# Altium integrated library wifi-plug.IntLib: 20 symbols
Pins are listed as number, name and electrical type; pins without a type are passive.

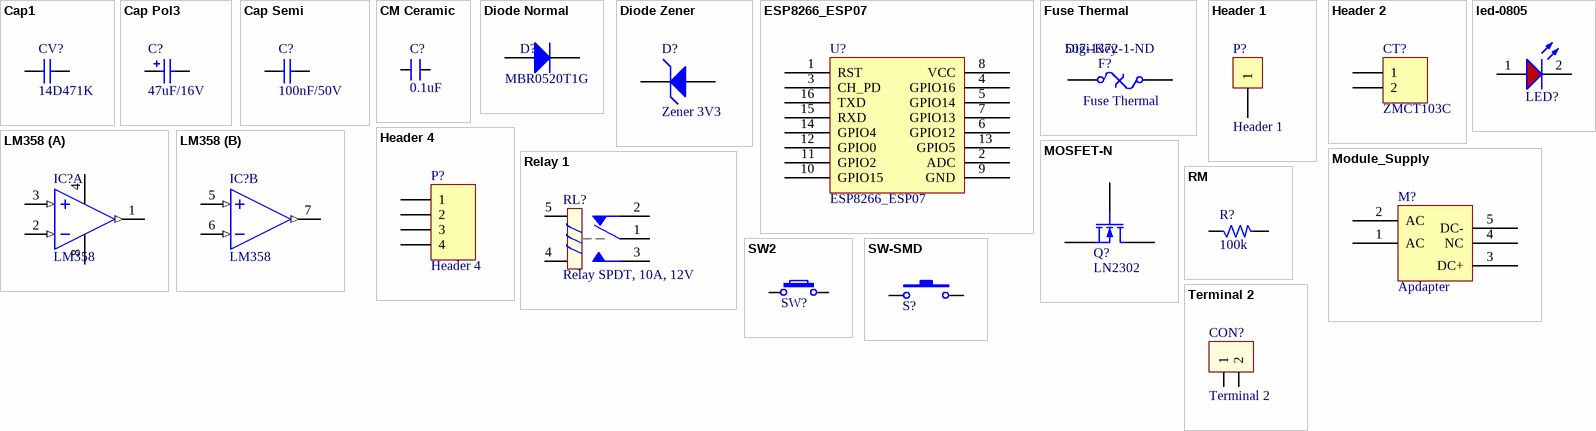
[diagram p0: symbols Cap1 to Terminal 2]

## Cap1
designator CV?  value 14D471K  (hidden comment: Cap1)
Polar Capacitor; Published: 8-Jun-2000; LatestRevisionDate: 17-Jul-2002; LatestRevisionNote: Re-released for DXP Platform.; PackageReference: RAD-0.3; Publisher: Altium Limited; PackageDescription: Radial Cap, Thru-Hole; 2 Leads; 0.3 in Pin Spacing
footprint C104/270V (Tu loc 220)
footprint C104/400V (Capacitor Polyester)
footprint C105/400V (Capacitor Polyester)
footprint C224/400V (Capacitor Polyester)
footprint C_Ceramic (Ceramic Capacitor)
footprint C_Ceramic_KV (Ceramic capacitors)
footprint C_Tantalum (Tantalum_Capacitor)
footprint C_Tantalum2 (Tantalum Capacitor)
pins: 1, 2

## Cap Pol3
designator C?, comment 47uF/16V
Polarized Capacitor (Surface Mount); Published: 8-Jun-2000; LatestRevisionDate: 29-May-2009; LatestRevisionNote: IPC-7351 Footprint Added.; PackageReference: C0805; Publisher: Altium Limited; PackageDescription: Chip Capacitor; Supplier 1: Newark; Supplier Part Number 1: 31T8184
footprint CAPC2012L (Chip Capacitor, Body 2.0x1.3mm, IPC High Density)
footprint CAPC4532L (Chip Capacitor, Body 4.5x3.2mm, IPC High Density)
footprint CAPC4564L (Chip Capacitor, Body 4.5x6.4mm, IPC High Density)
footprint CAPC5764L (Chip Capacitor, Body 5.7x6.4mm, IPC High Density)
footprint CAPC5750L (Chip Capacitor, Body 5.7x5.0mm, IPC High Density)
simulation model CAP (Capacitor)
signal-integrity model Cap Pol
footprint CAPC3216L
footprint C2312 (Chip Capacitor, 2-Leads, Body 7.30x4.30mm, IPC Medium Density)
pins: 1, 2
1 alternate drawing of the same symbol

## Cap Semi
designator C?, comment 100nF/50V
Capacitor 100n 16V 0603; Published: 8-Jun-2000; LatestRevisionDate: 29-May-2009; LatestRevisionNote: IPC-7351 Footprint Added.; PackageReference: C1206; Publisher: Altium Limited; PackageDescription: Chip Capacitor
footprint CAPC3216L (Chip Capacitor, Body 3.2x1.6mm, IPC High Density)
footprint CAPC1005L (Chip Capacitor, Body 1.0x0.5mm, IPC High Density)
footprint CAPC2512L (Chip Capacitor, Body 2.54x1.27mm, IPC High Density)
footprint CAPC1608L (Chip Capacitor, Body 1.6x0.8mm, IPC High Density)
footprint CAPC3225L (Chip Capacitor, Body 3.2x2.5mm, IPC High Density)
simulation model CAP (Semiconductor Capacitor)
signal-integrity model Cap Semi
footprint CAPC2012L
footprint C0805 (Chip Capacitor; Body 2.0 x 1.2 mm (LxW typ))
footprint C0603
footprint C1608L
footprint C2012L
pins: 1, 2

## CM Ceramic
designator C?, comment 0.1uF
SMD Ceramic  Capacitor; Manufacturer No: C0805KRX7R9BB104; Manufacturer: Yageo; Voltage: 50V; Tolerance: 10%; Capacitance: 0.1uF; Specification: ="Capacitance"+" "+"Voltage"+" " +"Tolerance"
footprint C0805 (Chip Capacitor; Body 2.0 x 1.2 mm (LxW typ))
footprint CM 0603
footprint CM 104
pins: 1, 2

## Diode Normal
designator D?, comment MBR0520T1G
Diode Normal; Published: 8-Jun-2000; LatestRevisionDate: 17-Jul-2002; LatestRevisionNote: Re-released for DXP Platform.; DatasheetDocument: 1997; PackageReference: DO-35; Publisher: Altium Limited; Code_JEDEC: DO-204-AH; ComponentLink1Description: Manufacturer Link; ComponentLink1URL: http://www.fairchildsemi.com/; ComponentLink2Description: Datasheet; ComponentLink2URL: http://www.fairchildsemi.com/ds/1N%2F1N4448.pdf
footprint SOD-123 W (SOD-123; 2 Leads; Body 2.7 x 1.6 mm, (LxW))
pins: 1 A, 2 K

## Diode Zener
designator D?, comment Zener 3V3
Zener Voltage Regulators; Manufacturer No: MMSZ5222BT1G; Manufacturer: ON Semiconductor; Specification: 500 mW SOD−123 Surface Mount
footprint SOD-123
pins: 1 K, 2 A

## ESP8266_ESP07
designator U?
footprint ESP_12 (ESP-12 Wi-Fi Module by AI-Thinker)
pins: 1 RST, 2 ADC, 3 CH_PD, 4 GPIO16, 5 GPIO14, 6 GPIO12, 7 GPIO13, 8 VCC, 9 GND, 10 GPIO15, 11 GPIO2, 12 GPIO0, 13 GPIO5, 14 GPIO4, 15 RXD, 16 TXD

## Fuse Thermal
designator F?  Supplier 1: Digi-Key  Supplier Part Number 1: 507-1372-1-ND
Thermal Fuse; Published: 24-Mar-1999; LatestRevisionDate: 17-Jul-2002; LatestRevisionNote: Re-released for DXP Platform.; PackageReference: PIN-W2/E2.8; Publisher: Altium Limited
footprint PTC1812
pins: 1, 2

## Header 1
designator P?
Header, 1-Pin; LatestRevisionDate: 17-Jul-2002; LatestRevisionNote: Re-released for DXP Platform.; Publisher: Altium Limited
footprint PAD 1
footprint HDR1X2 - female (Connector; Header; 2 Position)
pins: 1

## Header 2
designator CT?, comment ZMCT103C
Header, 2-Pin; LatestRevisionDate: 17-Jul-2002; LatestRevisionNote: Re-released for DXP Platform.; Publisher: Altium Limited
footprint ZMCT103C (Connector; Header; 2 Position)
footprint HDR1X2 - female (Connector; Header; 2 Position)
pins: 1, 2

## Header 4
designator P?
Header, 4-Pin; LatestRevisionDate: 17-Jul-2002; LatestRevisionNote: Re-released for DXP Platform.; Publisher: Altium Limited
footprint HDR1X4H (Connector; Header; 4 Position; Right Angle)
footprint HDR1X4 - FEMALE (Connector; Header; 4 Position)
pins: 1, 2, 3, 4

## led-0805
designator LED?, comment 150080RS75000  (value not drawn)
SMD mono-color Chip LED, WL-SMCW, Red; Manufacturer: W黵th Elektronik eiSos GmbH; PartNo: 150080RS75000; ComponentLink1Description: Manufacturer; ComponentLink1URL: http://www.we-online.de; Created by: Christin Otto; Created Date: June 2013; ComponentLink2Description: Datasheet; ComponentLink2URL: http://katalog.we-online.com/led/datasheet/150080RS75000.pdf; Color: Red
footprint led-3mm (THT, LED-3mm, 2pin- Body 4.15mm(max))
pins: 1 A, 2 C

## LM358
designator IC?
Low-Power Dual Operational Amplifier; Value: LM358
footprint SOIC8
part A pins: 1 OUT (out), 2 IN- (in), 3 IN+ (in), 4 -V, 8 +V
part B pins: 5 IN+ (in), 6 IN- (in), 7 OUT (out)

## Module_Supply
designator M?, comment Apdapter
footprint Module_Supply
pins: 1 AC, 2 AC, 3 DC+, 4 NC, 5 DC-

## MOSFET-N
designator Q?, comment LN2302
N-Channel MOSFET; Published: 8-Jun-2000; LatestRevisionDate: 17-Jul-2002; LatestRevisionNote: Re-released for DXP Platform.; PackageVersion: 1995/1996; PackageReference: E3; Publisher: Altium Limited; PackageDescription: TO, Flat Index; 3 In-Line, Axial Leads; Body Dia. 4.6mm; Lead Dia. 0.5 mm (max)
footprint SOT23-3 (2N7002KT1G)
pins: 1 G, 2 S, 3 D

## Relay 1
designator RL?, comment Relay SPDT, 10A, 12V
Relay SPDT,10A - 12VDC 5 Pin; Value: Relay SPDT, 10A, 12V
footprint RL_SPDT_10A (Relay SPDT, 5 pin, 10A,W 650mil, L 800mil, H 800mil)
footprint RL_T78
footprint RL-SLA-24/12VDC-SL-C (Relay 12V30A 5C SLA-12VDC-SL-A)
footprint RL-SLA-24/12VDC-SL-C (Relay 12V30A 5C SLA-12VDC-SL-A)
pins: 1, 2, 3, 4, 5

## RM
designator R?, comment 100k
Resistor SMD; Manufacturer No: RM10JTN102; Manufacturer: UniOhm; Power Rating: 1/10W; Value: 100k; Specification: ="Value" + "  "+ "Power Rating"
footprint R0805 (Chip Resistor; Body 2.0 x 1.2 mm (LxW typ))
footprint R 1206
footprint R 0603
footprint R 1/10W
pins: 1, 2

## SW2
designator SW?  (value not drawn)
footprint SMD(2)
pins: 1, 2

## SW-SMD
designator S?  (value not drawn)
Switch; Published: 24-Mar-1999; LatestRevisionDate: 17-Jul-2002; LatestRevisionNote: Re-released for DXP Platform.; PackageReference: SPST-2; Publisher: Altium Limited
footprint Button Tactile Switch
pins: 1, 2

## Terminal 2
designator CON?
Value: Connector 2
footprint domino-2pin-7.62
footprint Terminal 2 PIN (3.5 mm)
footprint Terminal block 2 (Terminal block 5.08mm 2 ways)
footprint Terminal block 2 SD (Terminal block 5.08mm 2 ways)
pins: 1, 2